# Altium footprint library Connector.PcbLib: 148 footprints (part 3 of 10)
Each footprint in its own frame and in the unit in brackets; x right, y up, seen from the top. Pads: shape width x height; smd on the part's side, far side on the other; paste and mask are expansions set on the pad; w line width, h text height; cw(c..) or ccw(c..) is an arc to the next point about the centre after c.
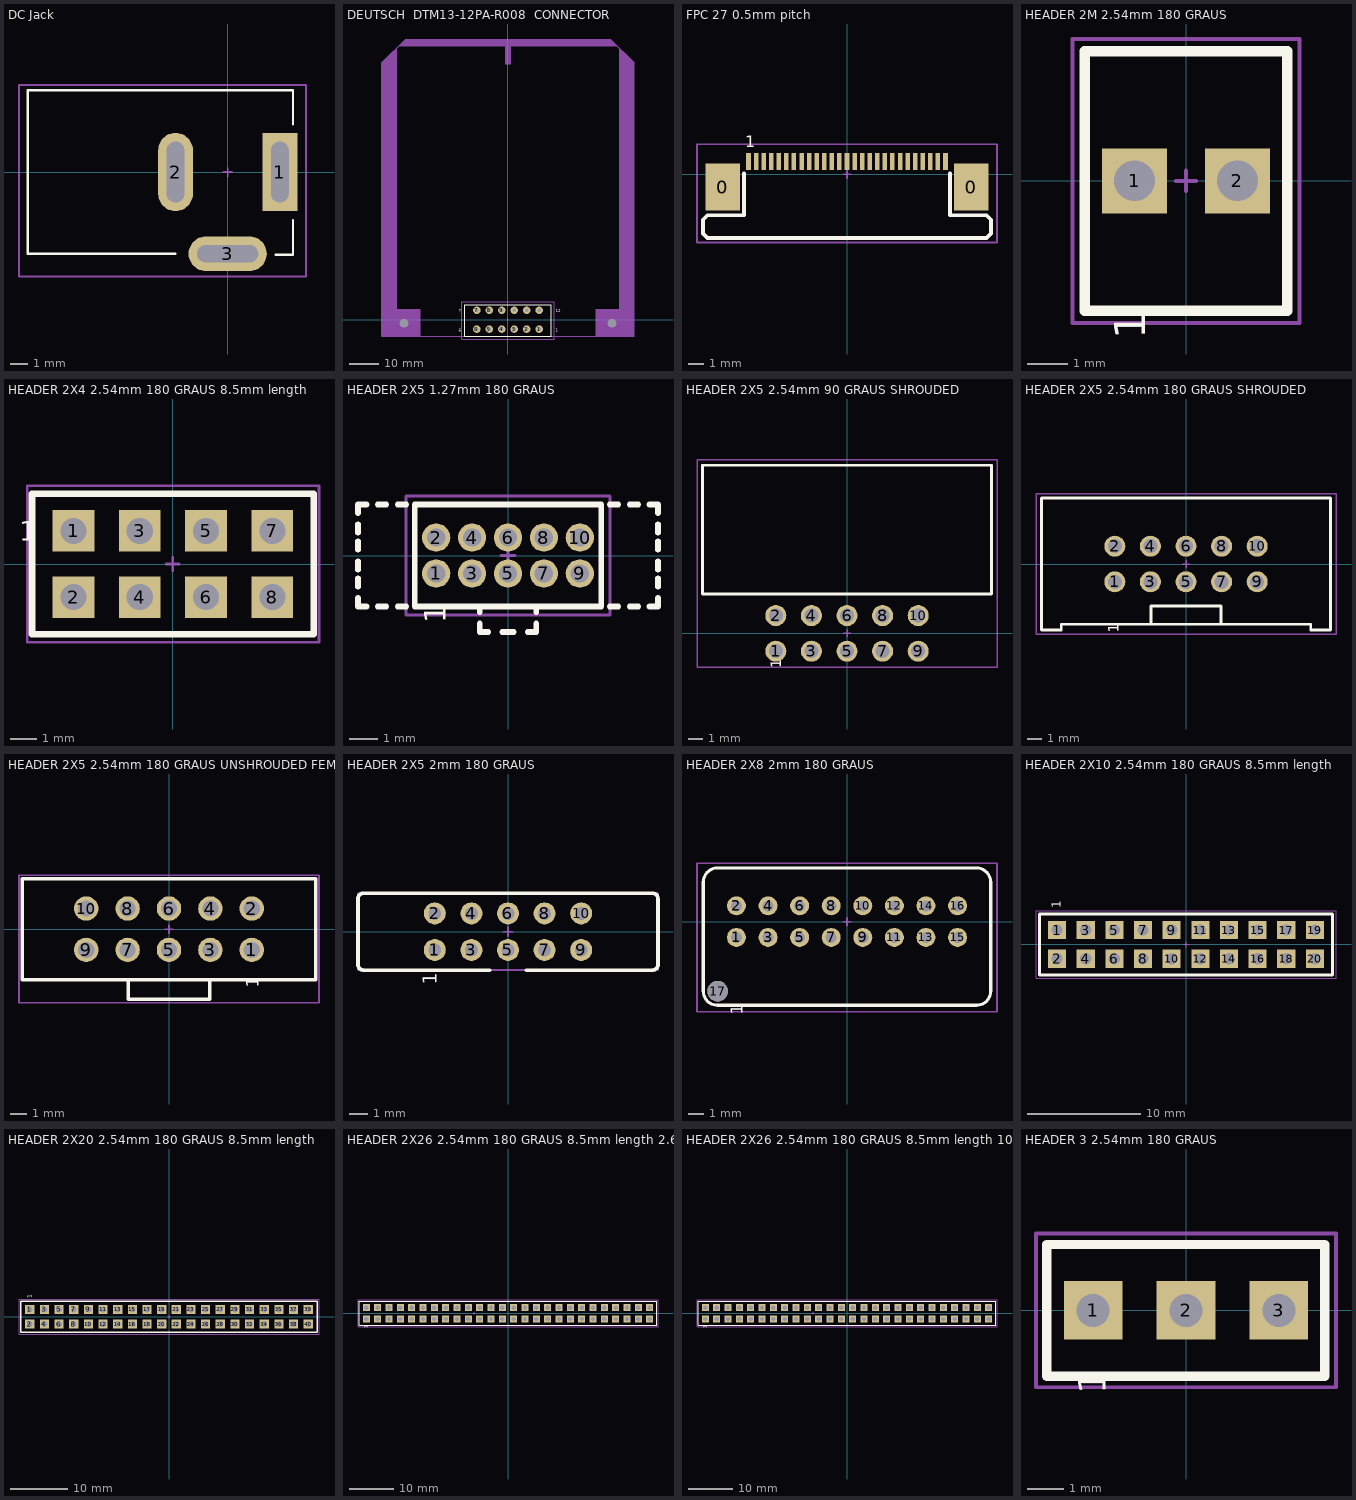
[diagram p2: the footprints below, top view; thin cyan lines are the x and y axes]

## DC Jack [mm]
height 11
pads (3):
  rect 2x4.5 hole 1 slot 3.5 at 90 deg: 1(3,0)
  oval 2x4.5 hole 1 slot 3.5 at 90 deg: 2(-3,0)
  oval 4.5x2 hole 1 slot 3.5 at 0 deg: 3(0,-4.7)
Top Overlay:
  lines w0.127: -3,-4.7 -11.5,-4.7 -11.5,4.7 3.75,4.7 3.75,2.75 ; 2.75,-4.75 3.75,-4.75 3.75,-2.75
Mechanical 15:
  lines w0.1: -0.25,0 0.25,0 ; 0,-0.25 0,0.25 ; -12,-6 4.5,-6 4.5,5 -12,5 -12,-6
3D body "DC Jack.step": height 11, standoff -3.5, extent -11.55,-4.7 3.75,4.655

## DEUTSCH  DTM13-12PA-R008  CONNECTOR [mm]
pads (14):
  round 1.6 hole 3 unplated: 0(-35,-1.2) 0(35,-1.2)
  round 2.5 hole 1.3: 1(10.5,-3.175) 2(6.3,-3.175) 3(2.1,-3.175) 4(-2.1,-3.175) 5(-6.3,-3.175) 6(-10.5,-3.175) 7(-10.5,3.175) 8(-6.3,3.175) 9(-2.1,3.175) 10(2.1,3.175) 11(6.3,3.175) 12(10.5,3.175)
Top Overlay:
  lines w0.2: -14.5,-5.5 -14.5,5 14.5,5 14.5,-5.5 -14.5,-5.5
  text "6" at -16.5,-4 h1
  text "7" at -16.5,2.5 h1
  text "12" at 16,2.5 h1
  text "1" at 16,-4 h1
Mechanical 1:
  lines w0.2: 42.5,5.5 42.5,50.5 ; -42.5,-5.5 -42.5,86.5 -34.5,94.5 34.5,94.5 42.5,86.5 42.5,-5.5 -42.5,-5.5
Mechanical 8:
  region: 37.5,3.5 29.5,3.5 29.5,-5.5 42.5,-5.5 42.5,86.5 34.5,94.5 -34.5,94.5 -42.5,86.5 -42.5,-5.5 -29.5,-5.5 -29.5,3.5 -37.5,3.5 -37.5,91.5 -37,92 -1,92 -1,86 1,86 1,92 37,92 37.5,91.5
Mechanical 15:
  lines w0.1: -0.25,0 0.25,0 ; 0,-0.25 0,0.25 ; -15.5,-6.5 -15.5,6 15.5,6 15.5,-6.5 -15.5,-6.5
3D body "c-dtm13-12pa-gr01-99-3d.STEP": height 25.8, standoff -9.2, extent -54.151,-31.909 54.151,5

## FPC 27 0.5mm pitch [mm] "FPC Connector, 0.5mm pitch"
height 2
pads (29):
  rect 2.3x3.1 smd: 0(-8.2,-0.85) 0(8.2,-0.85)
  rect 0.3x1.1 smd: 1(-6.5,0.85) 2(-6,0.85) 3(-5.5,0.85) 4(-5,0.85) 5(-4.5,0.85) 6(-4,0.85) 7(-3.5,0.85) 8(-3,0.85) 9(-2.5,0.85) 10(-2,0.85) 11(-1.5,0.85) 12(-1,0.85) 13(-0.5,0.85) 14(0,0.85) 15(0.5,0.85) 16(1,0.85) 17(1.5,0.85) 18(2,0.85) 19(2.5,0.85) 20(3,0.85) 21(3.5,0.85) 22(4,0.85) 23(4.5,0.85) 24(5,0.85) 25(5.5,0.85) 26(6,0.85) 27(6.5,0.85)
Top Overlay:
  lines w0.254: -6.8,0.05 -6.8,-2.7 -9.2,-2.7 -9.5,-3 -9.5,-3.9 -9.2,-4.2 9.2,-4.2 9.5,-3.9 9.5,-3 9.2,-2.7 6.8,-2.7 6.8,0.05
  text "1" at -6.7,1.8 h0.76
Mechanical 15:
  lines w0.1: -0.25,0 0.25,0 ; 0,-0.25 0,0.25 ; -9.9,-4.5 9.9,-4.5 9.9,2 -9.9,2 -9.9,-4.5
3D body "FPC 27 0.5 pitch 2-1734592-7.stp": height -0.4, standoff -2.45, extent -9.465,-4.11 9.465,1

## HEADER 2M 2.54mm 180 GRAUS [mm] "HEADER 3M 2.54mm 180 GRAUS"
pads (2):
  rect 1.6x1.6 hole 1: 1(-1.27,0) 2(1.27,0)
Top Overlay:
  lines w0.254: -2.5,-3.2 2.5,-3.2 2.5,3.2 -2.5,3.2 -2.5,-3.2
  text "1" at -1,-3.9 h0.76
Mechanical 15:
  lines w0.1: -0.25,0 0.25,0 ; 0,-0.25 0,0.25 ; -2.8,-3.5 2.8,-3.5 2.8,3.5 -2.8,3.5 -2.8,-3.5
3D body "HEADER 2M 2.54mm 180 GRAUS.STEP": height 10.68, standoff -3.54, extent -2.54,-3.251 2.54,3.099

## HEADER 2X4 2.54mm 180 GRAUS 8.5mm length [mm]
height 25
pads (8):
  rect 1.6x1.6 hole 1: 1(-3.81,1.27) 2(-3.81,-1.27) 3(-1.27,1.27) 4(-1.27,-1.27) 5(1.27,1.27) 6(1.27,-1.27) 7(3.81,1.27) 8(3.81,-1.27)
Top Overlay:
  lines w0.254: -5.4,-2.7 5.4,-2.7 5.4,2.7 -5.4,2.7 -5.4,-2.7
  text "1" at -5.9,0.9 h0.76
Mechanical 15:
  lines w0.1: -0.25,0 0.25,0 ; 0,-0.25 0,0.25 ; -5.58,-3 5.6,-3 5.6,3 -5.58,3 -5.58,-3
3D body "Header 2x4 2.54mm.STEP": height 8.5, standoff -2.6, extent -5.23,-2.5 5.23,2.5

## HEADER 2X5 1.27mm 180 GRAUS [mm] "HEADER 2X5 1.27mm 180 GRAUS"
height 7.35
pads (10):
  round 1 hole 0.65: 1(-2.54,-0.635) 2(-2.54,0.635) 3(-1.27,-0.635) 4(-1.27,0.635) 5(0,-0.635) 6(0,0.635) 7(1.27,-0.635) 8(1.27,0.635) 9(2.54,-0.635) 10(2.54,0.635)
Top Overlay:
  lines w0.2: -5.3,-1.5 -5.3,-1.8 -5,-1.8 ; -5.3,-1.1 -5.3,-0.8 ; -5.3,-0.5 -5.3,-0.2 ; -5.3,0.2 -5.3,0.5 ; -5.3,0.8 -5.3,1.1 ; -5.3,1.5 -5.3,1.8 -5,1.8 ; -4.6,-1.8 -4.3,-1.8 ; -4.6,1.8 -4.3,1.8 ; -3.9,-1.8 -3.6,-1.8 ; -3.9,1.8 -3.6,1.8 ; -1,-2.4 -1,-2.7 -0.7,-2.7 ; -1,-2 -1,-1.8 ; -0.2,-2.7 0.2,-2.7 ; 0.7,-2.7 1,-2.7 1,-2.4 ; 1,-2 1,-1.8 ; 3.6,-1.8 3.9,-1.8 ; 3.6,1.8 3.9,1.8 ; 4.3,-1.8 4.6,-1.8 ; 4.3,1.8 4.6,1.8 ; 5,-1.8 5.3,-1.8 5.3,-1.5 ; 5,1.8 5.3,1.8 5.3,1.5 ; 5.3,-1.1 5.3,-0.8 ; 5.3,-0.5 5.3,-0.2 ; 5.3,0.2 5.3,0.5 ; 5.3,0.8 5.3,1.1 ; -3.3,-1.8 3.3,-1.8 3.3,1.8 -3.3,1.8 -3.3,-1.8
  text "1" at -2.2,-2.4 h0.76
Mechanical 15:
  lines w0.1: -0.25,0 0.25,0 ; 0,-0.25 0,0.25 ; -3.6,-2.1 -3.6,2.1 3.6,2.1 3.6,-2.1 -3.6,-2.1
3D body "FTS-105-01-X-D.STEP": height 3.91, standoff -2.29, extent -3.175,-1.714 3.175,1.715

## HEADER 2X5 2.54mm 90 GRAUS SHROUDED [mm] "HEADER 2X5 1.27mm 90 GRAUS SHROUDED"
height 7.35
pads (10):
  round 1.5 hole 1: 1(-5.08,-1.27) 2(-5.08,1.27) 3(-2.54,-1.27) 4(-2.54,1.27) 5(0,-1.27) 6(0,1.27) 7(2.54,-1.27) 8(2.54,1.27) 9(5.08,-1.27) 10(5.08,1.27)
Top Overlay:
  lines w0.2: -10.3,2.8 -10.3,12 10.3,12 10.3,2.8 -10.3,2.8
  text "1" at -4.7,-2.5 h0.76
Mechanical 15:
  lines w0.1: -0.25,0 0.25,0 ; 0,-0.25 0,0.25 ; -10.7,-2.4 10.7,-2.4 10.7,12.4 -10.7,12.4 -10.7,-2.4
3D body "User Library-Header  right angle 10way (2x5).STEP": height 9.2, standoff -2.24, extent -10.15,-1.6 10.15,11.836

## HEADER 2X5 2.54mm 180 GRAUS SHROUDED [mm] "HEADER 2X5 1.27mm 180 GRAUS SHROUDED"
height 7.35
pads (10):
  round 1.5 hole 1: 1(-5.08,-1.27) 2(-5.08,1.27) 3(-2.54,-1.27) 4(-2.54,1.27) 5(0,-1.27) 6(0,1.27) 7(2.54,-1.27) 8(2.54,1.27) 9(5.08,-1.27) 10(5.08,1.27)
Top Overlay:
  lines w0.2: -9.3,-4.7 -10.3,-4.7 ; -2.5,-4.3 -2.5,-3 2.5,-3 2.5,-4.3 ; -10.3,-4.7 -10.3,4.7 10.3,4.7 10.3,-4.7 8.9,-4.7 8.9,-4.3 -8.9,-4.3 -8.9,-4.7 -10.3,-4.7
  text "1" at -4.8,-4.9 h0.76
Mechanical 15:
  lines w0.1: -0.25,0 0.25,0 ; 0,-0.25 0,0.25 ; -10.7,-5 10.7,-5 10.7,5 -10.7,5 -10.7,-5
3D body "User Library-Tyco - 5103308-1 (Shrouded Header 2_54mm 10 Pin).STEP": height 9.86, standoff -3.05, extent -10.16,-4.572 10.16,4.572

## HEADER 2X5 2.54mm 180 GRAUS UNSHROUDED FEMALE [mm]
height 7.35
pads (10):
  round 1.5 hole 1: 1(5.08,-1.27) 2(5.08,1.27) 3(2.54,-1.27) 4(2.54,1.27) 5(0,-1.27) 6(0,1.27) 7(-2.54,-1.27) 8(-2.54,1.27) 9(-5.08,-1.27) 10(-5.08,1.27)
Top Overlay:
  lines w0.2: -2.5,-3.1 -2.5,-4.3 2.5,-4.3 2.5,-3.1 ; -9,-3.1 9,-3.1 9,3.1 -9,3.1 -9,-3.1
  text "1" at 5.5,-3.6 h0.76
Mechanical 15:
  lines w0.1: -0.25,0 0.25,0 ; 0,-0.25 0,0.25 ; -9.2,-4.5 -9.2,3.3 9.2,3.3 9.2,-4.5 -9.2,-4.5
3D body "SFH11-_ _ _C-D05-ST-_ _-M181.STEP": height 8.65, standoff -3.05, extent -8.89,-3 8.89,3

## HEADER 2X5 2mm 180 GRAUS [mm]
height 7.35
pads (10):
  round 1.2 hole 0.7: 1(-4,-1) 2(-4,1) 3(-2,-1) 4(-2,1) 5(0,-1) 6(0,1) 7(2,-1) 8(2,1) 9(4,-1) 10(4,1)
Top Overlay:
  lines w0.2: -1,-2.1 -7.9,-2.1 cw(c-7.9,-1.8) -8.2,-1.8 -8.2,1.8 cw(c-7.9,1.8) -7.9,2.1 7.9,2.1 cw(c7.9,1.8) 8.2,1.8 8.2,-1.8 cw(c7.9,-1.8) 7.9,-2.1 1,-2.1
  text "1" at -3.9,-2.9 h0.76
Mechanical 15:
  lines w0.1: -7.95,2.1 -8.2,2.1 ; -0.25,0 0.25,0 ; 0,-0.25 0,0.25 ; 4.75,2.1 -4.75,2.1 -8.2,2.1 ; 5,-2.1 -8.2,-2.1 -8.2,2.1 ; 7.95,2.1 8.2,2.1 8.2,-2.1
3D body "SBH21-NBPN-D05-ST-BK.STEP": height 5.6, standoff -2.3, extent -8.55,-2.7 8.65,2.7

## HEADER 2X8 2mm 180 GRAUS [mm]
height 7.35
pads (17):
  round 1.2 hole 0.7: 1(-7,-1) 2(-7,1) 3(-5,-1) 4(-5,1) 5(-3,-1) 6(-3,1) 7(-1,-1) 8(-1,1) 9(1,-1) 10(1,1) 11(3,-1) 12(3,1) 13(5,-1) 14(5,1) 15(7,-1) 16(7,1)
  round 1.3 hole 1.3: 17(-8.2,-4.4)
Top Overlay:
  lines w0.2: -9.1,-4.4 ccw(c-8.2,-4.4) -8.2,-5.3 8.2,-5.3 ccw(c8.2,-4.4) 9.1,-4.4 9.1,2.5 ccw(c8.2,2.5) 8.2,3.4 -8.2,3.4 ccw(c-8.2,2.5) -9.1,2.5 -9.1,-4.4
  text "1" at -6.6,-5.9 h0.76
Mechanical 15:
  lines w0.1: -0.25,0 0.25,0 ; 0,-0.25 0,0.25 ; -9.5,-5.7 9.5,-5.7 9.5,3.7 -9.5,3.7 -9.5,-5.7

## HEADER 2X10 2.54mm 180 GRAUS 8.5mm length [mm] "HEADER 5 2.54mm 180 GRAUS"
height 8.5
pads (20):
  rect 1.6x1.6 hole 1: 1(-11.43,1.27) 2(-11.43,-1.27) 3(-8.89,1.27) 4(-8.89,-1.27) 5(-6.35,1.27) 6(-6.35,-1.27) 7(-3.81,1.27) 8(-3.81,-1.27) 9(-1.27,1.27) 10(-1.27,-1.27) 11(1.27,1.27) 12(1.27,-1.27) 13(3.81,1.27) 14(3.81,-1.27) 15(6.35,1.27) 16(6.35,-1.27) 17(8.89,1.27) 18(8.89,-1.27) 19(11.43,1.27) 20(11.43,-1.27)
Top Overlay:
  lines w0.254: -13,-2.7 13,-2.7 13,2.7 -13,2.7 -13,-2.7
  text "1" at -11.1,3.2 h0.76
Mechanical 15:
  lines w0.1: -0.25,0 0.25,0 ; 0,-0.25 0,0.25 ; -13.3,-3 13.3,-3 13.3,3 -13.3,3 -13.3,-3
3D body "Header 2x10 2.54mm.STEP": height 8.6, standoff -2.5, extent -12.85,-2.5 12.85,2.5

## HEADER 2X20 2.54mm 180 GRAUS 8.5mm length [mm] "HEADER 5 2.54mm 180 GRAUS"
height 8.5
pads (40):
  rect 1.6x1.6 hole 1: 1(-24.13,1.27) 2(-24.13,-1.27) 3(-21.59,1.27) 4(-21.59,-1.27) 5(-19.05,1.27) 6(-19.05,-1.27) 7(-16.51,1.27) 8(-16.51,-1.27) 9(-13.97,1.27) 10(-13.97,-1.27) 11(-11.43,1.27) 12(-11.43,-1.27) 13(-8.89,1.27) 14(-8.89,-1.27) 15(-6.35,1.27) 16(-6.35,-1.27) 17(-3.81,1.27) 18(-3.81,-1.27) 19(-1.27,1.27) 20(-1.27,-1.27) 21(1.27,1.27) 22(1.27,-1.27) 23(3.81,1.27) 24(3.81,-1.27) 25(6.35,1.27) 26(6.35,-1.27) 27(8.89,1.27) 28(8.89,-1.27) 29(11.43,1.27) 30(11.43,-1.27) 31(13.97,1.27) 32(13.97,-1.27) 33(16.51,1.27) 34(16.51,-1.27) 35(19.05,1.27) 36(19.05,-1.27) 37(21.59,1.27) 38(21.59,-1.27) 39(24.13,1.27) 40(24.13,-1.27)
Top Overlay:
  lines w0.254: -25.7,-2.7 25.7,-2.7 25.7,2.7 -25.7,2.7 -25.7,-2.7
  text "1" at -23.8,3.2 h0.76
Mechanical 15:
  lines w0.1: -0.25,0 0.25,0 ; 0,-0.25 0,0.25 ; -26,-3 26,-3 26,3 -26,3 -26,-3
3D body "User Library-PBD2_54-40.STEP": height 8.5, standoff -2.6, extent -25.4,-2.54 25.4,2.54

## HEADER 2X26 2.54mm 180 GRAUS 8.5mm length 2.64mm contacts length [mm] "HEADER 5 2.54mm 180 GRAUS"
height 8.5
pads (52):
  rect 1.6x1.6 hole 1: 1(-31.75,-1.27) 2(-31.75,1.27) 3(-29.21,-1.27) 4(-29.21,1.27) 5(-26.67,-1.27) 6(-26.67,1.27) 7(-24.13,-1.27) 8(-24.13,1.27) 9(-21.59,-1.27) 10(-21.59,1.27) 11(-19.05,-1.27) 12(-19.05,1.27) 13(-16.51,-1.27) 14(-16.51,1.27) 15(-13.97,-1.27) 16(-13.97,1.27) 17(-11.43,-1.27) 18(-11.43,1.27) 19(-8.89,-1.27) 20(-8.89,1.27) 21(-6.35,-1.27) 22(-6.35,1.27) 23(-3.81,-1.27) 24(-3.81,1.27) 25(-1.27,-1.27) 26(-1.27,1.27) 27(1.27,-1.27) 28(1.27,1.27) 29(3.81,-1.27) 30(3.81,1.27) 31(6.35,-1.27) 32(6.35,1.27) 33(8.89,-1.27) 34(8.89,1.27) 35(11.43,-1.27) 36(11.43,1.27) 37(13.97,-1.27) 38(13.97,1.27) 39(16.51,-1.27) 40(16.51,1.27) 41(19.05,-1.27) 42(19.05,1.27) 43(21.59,-1.27) 44(21.59,1.27) 45(24.13,-1.27) 46(24.13,1.27) 47(26.67,-1.27) 48(26.67,1.27) 49(29.21,-1.27) 50(29.21,1.27) 51(31.75,-1.27) 52(31.75,1.27)
Top Overlay:
  lines w0.254: -33.32,-2.7 33.32,-2.7 33.32,2.7 -33.32,2.7 -33.32,-2.7
  text "1" at -31.4,-3.3 h0.76
Mechanical 15:
  lines w0.1: -7.87,0 -7.37,0 ; -7.62,-0.25 -7.62,0.25 ; -33.62,-3 33.62,-3 33.62,3 -33.62,3 -33.62,-3
3D body "SSW-126-01-G-D.stp": height 8.51, standoff -2.64, extent -33.274,-2.476 33.274,2.477

## HEADER 2X26 2.54mm 180 GRAUS 8.5mm length 10mm contacts length [mm] "HEADER 5 2.54mm 180 GRAUS"
height 8.5
pads (52):
  rect 1.6x1.6 hole 1: 1(-31.75,-1.27) 2(-31.75,1.27) 3(-29.21,-1.27) 4(-29.21,1.27) 5(-26.67,-1.27) 6(-26.67,1.27) 7(-24.13,-1.27) 8(-24.13,1.27) 9(-21.59,-1.27) 10(-21.59,1.27) 11(-19.05,-1.27) 12(-19.05,1.27) 13(-16.51,-1.27) 14(-16.51,1.27) 15(-13.97,-1.27) 16(-13.97,1.27) 17(-11.43,-1.27) 18(-11.43,1.27) 19(-8.89,-1.27) 20(-8.89,1.27) 21(-6.35,-1.27) 22(-6.35,1.27) 23(-3.81,-1.27) 24(-3.81,1.27) 25(-1.27,-1.27) 26(-1.27,1.27) 27(1.27,-1.27) 28(1.27,1.27) 29(3.81,-1.27) 30(3.81,1.27) 31(6.35,-1.27) 32(6.35,1.27) 33(8.89,-1.27) 34(8.89,1.27) 35(11.43,-1.27) 36(11.43,1.27) 37(13.97,-1.27) 38(13.97,1.27) 39(16.51,-1.27) 40(16.51,1.27) 41(19.05,-1.27) 42(19.05,1.27) 43(21.59,-1.27) 44(21.59,1.27) 45(24.13,-1.27) 46(24.13,1.27) 47(26.67,-1.27) 48(26.67,1.27) 49(29.21,-1.27) 50(29.21,1.27) 51(31.75,-1.27) 52(31.75,1.27)
Top Overlay:
  lines w0.254: -33.32,-2.7 33.32,-2.7 33.32,2.7 -33.32,2.7 -33.32,-2.7
  text "1" at -31.4,-3.3 h0.76
Mechanical 15:
  lines w0.1: -7.87,0 -7.37,0 ; -7.62,-0.25 -7.62,0.25 ; -33.62,-3 33.62,-3 33.62,3 -33.62,3 -33.62,-3
3D body "SSQ-126-03-G-D.stp": height 8.51, standoff -10.01, extent -33.274,-2.476 33.274,2.477

## HEADER 3 2.54mm 180 GRAUS [mm] "HEADER 3 2.54mm 180 GRAUS"
height 8.64
pads (3):
  rect 1.6x1.6 hole 0.9: 1(-2.54,0) 2(0,0) 3(2.54,0)
Top Overlay:
  lines w0.254: -3.81,-1.8 3.79,-1.8 3.79,1.8 -3.81,1.8 -3.81,-1.8
  text "1" at -2.2,-2.3 h0.76
Mechanical 15:
  lines w0.1: -0.25,0 0.25,0 ; 0,-0.25 0,0.25 ; -4.1,-2.1 4.1,-2.1 4.1,2.1 -4.1,2.1 -4.1,-2.1
3D body "HEADER 3 2.54mm 180 GRAUS.stp": height 8.7, standoff -2.86, extent -3.81,-1.778 3.81,1.778